# Altium footprint library DataDriven_PCB2.PcbLib: 59 footprints (part 4 of 4)
Each footprint in its own frame and in the unit in brackets; x right, y up, seen from the top. Pads: shape width x height; smd on the part's side, far side on the other; paste and mask are expansions set on the pad; w line width, h text height; cw(c..) or ccw(c..) is an arc to the next point about the centre after c.
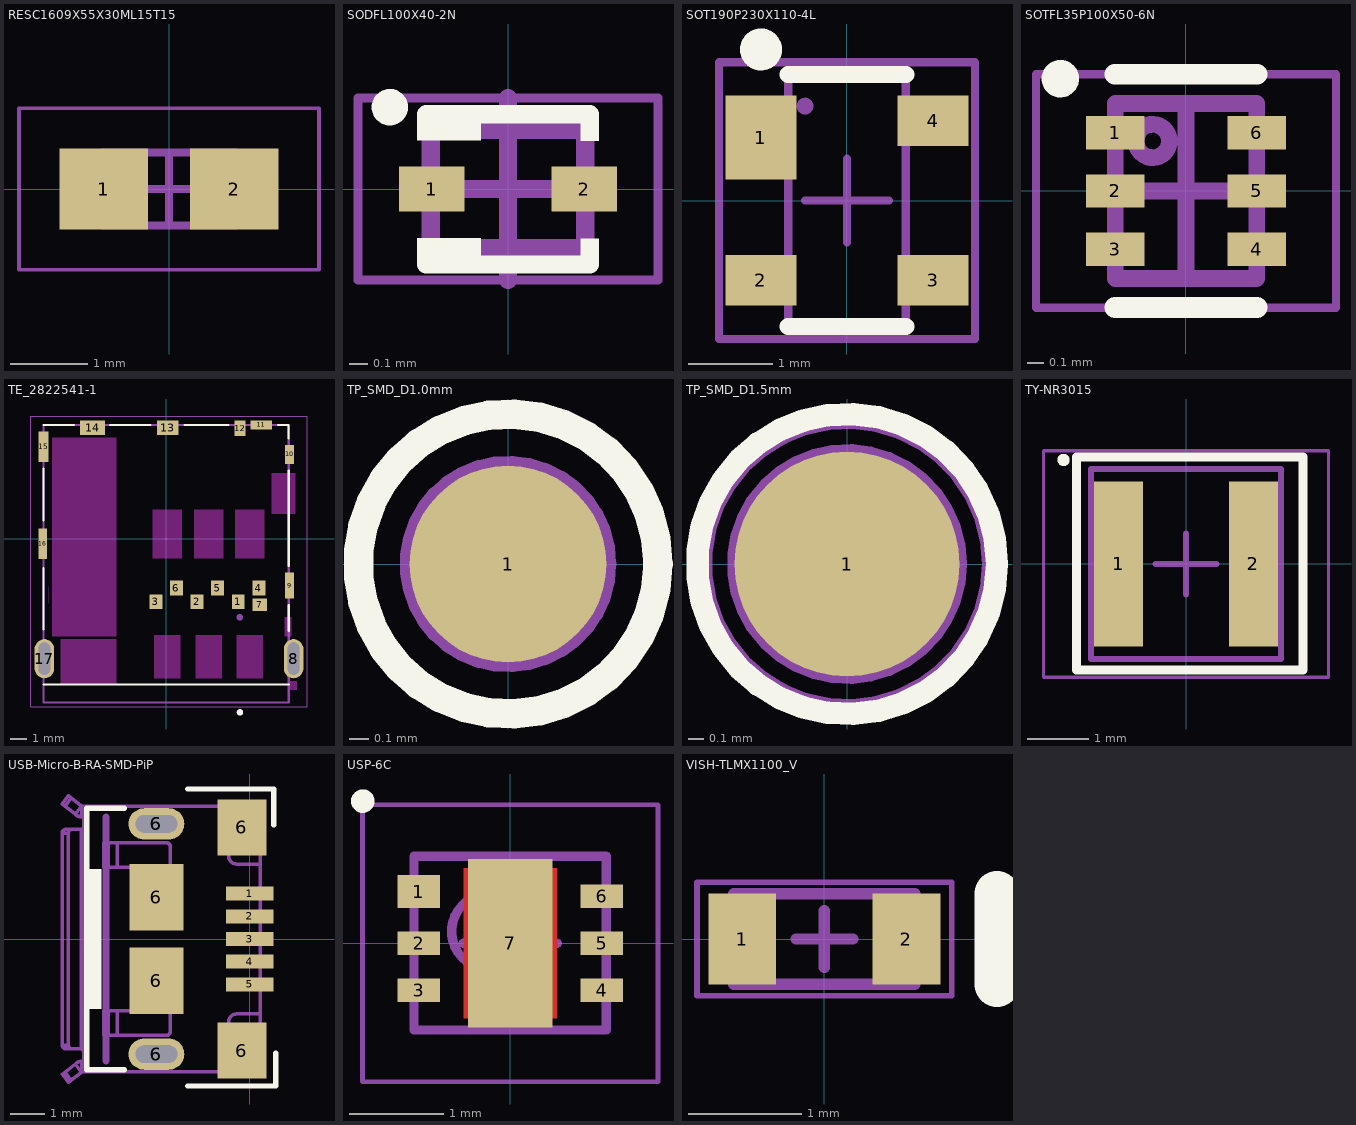
[diagram p3: the footprints below, top view; thin cyan lines are the x and y axes]

## RESC1609X55X30ML15T15 [mm] "Chip Resistor, 2-Leads, Body 1.75x0.95mm, IPC Low Density"
height 0.55
pads (2):
  rect 1.15x1.05 smd: 1(-0.85,0) 2(0.85,0)
Mechanical 13:
  lines w0.1: -0.875,-0.475 -0.875,0.475 0.875,0.475 0.875,-0.475 -0.875,-0.475
Mechanical 15:
  lines w0.05: -1.95,-1.05 -1.95,1.05 1.95,1.05 1.95,-1.05 -1.95,-1.05
  lines w0.1: -0.475,0 0.475,0 ; 0,-0.475 0,0.475
3D body "RESC1608X06M.step": height 0.55, standoff 0, extent -0.875,-0.475 0.875,0.475

## SODFL100X40-2N [mm]
pads (2):
  rect 0.36x0.25 smd: 1(-0.42,0) 2(0.42,0)
Top Overlay:
  circle w0.1: c-0.65,0.45 r0.05
  rectangle: 0.4,0.265 0.5,0.415
  rectangle: 0.4,-0.421 0.5,-0.271
  rectangle: -0.5,-0.396 -0.15,-0.271
  rectangle: -0.5,0.265 -0.15,0.39
  lines w0.1: -0.45,-0.365 -0.45,-0.415 0.45,-0.415 0.45,-0.349 ; -0.45,0.361 -0.45,0.411 0.45,0.411 0.45,0.361
Mechanical 7:
  lines w0.1: -0.425,-0.325 -0.425,0.325 0.425,0.325 0.425,-0.325 -0.425,-0.325
  text ".Designator" at -0.724,-0.177 h0.38
Mechanical 15:
  lines w0.05: -0.825,-0.5 0.825,-0.5 0.825,0.5 -0.825,0.5 -0.825,-0.5
  lines w0.1: -0.5,0 0.5,0 ; 0,-0.5 0,0.5
3D body "SODFL100X40-2N.step": height 0.4, standoff 0, extent -0.5,-0.325 0.5,0.325

## SOT190P230X110-4L [mm]
pads (4):
  rect 0.85x1 smd: 1(-1.025,0.75)
  rect 0.85x0.6 smd: 2(-1.025,-0.95) 3(1.025,-0.95) 4(1.025,0.95)
Top Overlay:
  circle w0.25: c-1.025,1.8 r0.125
  lines w0.203: -0.7,-1.5 0.7,-1.5 ; -0.7,1.5 0.7,1.5
Mechanical 7:
  circle w0.1: c-0.5,1.125 r0.05
  lines w0.1: -0.7,-1.5 -0.7,1.5 0.7,1.5 0.7,-1.5 -0.7,-1.5
  text ".Designator" at -0.225,1.375 h0.69
Mechanical 15:
  lines w0.1: -0.5,0 0.5,0 ; 0,-0.5 0,0.5 ; -1.525,-1.65 -1.525,1.65 1.525,1.65 1.525,-1.65 -1.525,-1.65
3D body "User Library-sot143.step": height 1, standoff 0, extent -1.21,-1.46 1.21,1.46

## SOTFL35P100X50-6N [mm]
pads (6):
  rect 0.35x0.2 smd mask+0.05: 1(-0.425,0.35) 2(-0.425,0) 3(-0.425,-0.35) 4(0.425,-0.35) 5(0.425,0) 6(0.425,0.35)
Top Overlay:
  circle w0.125: c-0.754,0.674 r0.05
  lines w0.125: -0.425,-0.7 0.425,-0.7 ; -0.425,0.7 0.425,0.7
Mechanical 7:
  circle w0.1: c-0.2,0.3 r0.1
  lines w0.1: -0.425,-0.525 0.425,-0.525 0.425,0.525 -0.425,0.525 -0.425,-0.525
  text ".Designator" at 0.325,-0.4 h0.3
Mechanical 15:
  lines w0.05: -0.9,-0.7 -0.9,0.7 0.9,0.7 0.9,-0.7 -0.9,-0.7
  lines w0.1: -0.5,0 0.5,0 ; 0,-0.5 0,0.5
3D body "SOTFL35P100X50-6N.step": height 0.5, standoff 0, extent -0.5,-0.523 0.5,0.523

## TE_2822541-1 [mm]
height 0.4
pads (17):
  rect 0.8x0.9 smd: 1(4.44,-3.88) 2(1.9,-3.88) 3(-0.64,-3.88) 4(5.71,-3.03) 5(3.17,-3.03) 6(0.63,-3.03)
  rect 0.9x0.75 smd: 7(5.77,-4.055)
  oval 1.208x2.416 hole 0.7 slot 2 at 90 deg: 8(7.85,-7.38) 17(-7.5,-7.38)
  rect 0.54x1.6 smd: 9(7.6,-2.88)
  rect 0.54x1.17 smd: 10(7.6,5.205)
  rect 1.33x0.55 smd: 11(5.865,7.025)
  rect 0.7x0.98 smd: 12(4.55,6.81)
  rect 1.3x0.91 smd: 13(0.1,6.845)
  rect 1.53x0.91 smd: 14(-4.535,6.845)
  rect 0.6x1.9 smd: 15(-7.55,5.67)
  rect 0.5x1.9 smd: 16(-7.6,-0.3)
Top Layer keep-out:
  region: -5.233,-8.9 -6.249,-8.9 -6.249,-8.59 -5.233,-8.59
  region: -3.089,-8.95 -6.503,-8.95 -6.503,-6.18 -3.089,-6.18
  region: -3.089,-8.95 -6.503,-8.95 -6.503,-6.18 -3.089,-6.18
  region: -5.795,-8.839 -6.195,-8.839 -6.195,-8.529 -5.795,-8.529
  region: -3.089,-5.989 -7.011,-5.989 -7.011,6.221 -3.089,6.221
  region: -3.089,-5.735 -6.757,-5.735 -6.757,5.949 -3.089,5.949
  region: -6.249,-5.735 -6.757,-5.735 -6.757,4.72 -6.249,4.72
  region: -7.257,-3.195 -7.256,-3.449 -7.257,-2.941 -7.25,-3.957
  region: 7.7,-5.735 7.3,-5.735 7.3,-4.83 7.7,-4.83
  region: 7.7,-5.989 7.3,-5.989 7.3,-4.83 7.7,-4.83
  region: 8.05,-9.037 7.65,-9.037 7.65,-8.783 8.05,-8.783
  region: 8.05,-9.291 7.65,-9.291 7.65,-9.037 8.05,-9.037
  region: 7.955,1.54 6.505,1.54 6.505,4.05 7.955,4.05
  region: 7.955,1.54 6.505,1.54 6.505,4.05 7.955,4.05
  region: 6.05,-1.21 4.26,-1.21 4.26,1.79 6.05,1.79
  region: 3.51,-1.21 1.72,-1.21 1.72,1.79 3.51,1.79
  region: 3.51,-1.21 1.72,-1.21 1.72,1.79 3.51,1.79
  region: 6.05,-1.21 4.26,-1.21 4.26,1.79 6.05,1.79
  region: 0.97,-1.21 -0.82,-1.21 -0.82,1.79 0.97,1.79
  region: 0.97,-1.21 -0.82,-1.21 -0.82,1.79 0.97,1.79
  region: 0.87,-8.6 -0.72,-8.6 -0.72,-5.93 0.87,-5.93
  region: 0.87,-8.6 -0.72,-8.6 -0.72,-5.93 0.87,-5.93
  region: 3.41,-8.6 1.82,-8.6 1.82,-5.93 3.41,-5.93
  region: 3.41,-8.6 1.82,-8.6 1.82,-5.93 3.41,-5.93
  region: 5.95,-8.6 4.36,-8.6 4.36,-5.93 5.95,-5.93
  region: 5.95,-8.6 4.36,-8.6 4.36,-5.93 5.95,-5.93
Top Overlay:
  circle w0.2: c4.546,-10.688 r0.1
  lines w0.127: -7.55,-8.98 7.55,-8.98 ; -7.55,-5.58 -7.55,-1.79 ; -7.55,1.13 -7.55,4.32 ; -7.55,7 -5.665,7 ; -3.465,7 -0.965,7 ; 1.135,7 3.835,7 ; 6.885,7 7.535,7 7.535,6.17 ; 7.55,-5.68 7.55,-4.08 ; 7.55,-1.68 7.55,4.22
Mechanical 13:
  circle w0.2: c4.535,-4.83 r0.1
  lines w0.127: -7.55,-10.08 7.55,-10.08 7.55,7 -7.55,7 -7.55,-10.08
Mechanical 15:
  lines w0.05: -8.355,-10.33 8.705,-10.33 8.705,7.55 -8.355,7.55 -8.355,-10.33
3D body "c-2822541-1-c-3d.stp": height 1.29, standoff -0.6, extent -7.6,-8.89 7.89,7.11

## TP_SMD_D1.0mm [mm]
height 0.9
pads (1):
  round 1 smd paste-5: 1(0,0)
Top Overlay:
  circle w0.15: c0,0 r0.762
Mechanical 7:
  circle w0.1: c0,0 r0.762
  circle w0.1: c0,0 r0.5
  text ".Designator" at -0.633,0.918 h0.38

## TP_SMD_D1.5mm [mm]
height 0.9
pads (1):
  round 1.5 smd paste-5: 1(0,0)
Top Overlay:
  circle w0.15: c0,0 r1
Mechanical 7:
  circle w0.1: c0,0 r0.75
  circle w0.1: c0,0 r0.95
  text ".Designator" at -0.3,1.3 h0.38
3D body: height 0.05, standoff 0, extent -0.75,-0.75 0.75,0.75

## TY-NR3015 [mm]
pads (2):
  rect 0.8x2.7 smd: 1(-1.1,0) 2(1.1,0)
Top Overlay:
  circle w0.1: c-2,1.7 r0.05
  lines w0.15: -1.788,-1.731 -1.788,1.749 1.909,1.749 1.909,-1.731 -1.788,-1.731
Mechanical 7:
  lines w0.1: -1.55,-1.55 1.55,-1.55 1.55,1.55 -1.55,1.55 -1.55,-1.55
  text ".Designator" at -1.143,0 h0.38
Mechanical 13:
  lines w0.1: -1.55,-1.55 1.55,-1.55 1.55,1.55 -1.55,1.55 -1.55,-1.55
Mechanical 15:
  lines w0.05: -2.325,-1.85 -2.325,1.85 2.325,1.85 2.325,-1.85 -2.325,-1.85
  lines w0.1: -0.5,0 0.5,0 ; 0,-0.5 0,0.5
3D body "User Library-nr3015.step": height 1.35, standoff -0.15, extent -1.5,-1.5 1.5,1.5

## USB-Micro-B-RA-SMD-PiP [mm]
pads (13):
  rect 1.35x0.4 smd: 1(0,1.3) 2(0,0.65) 3(0,0) 4(0,-0.65) 5(0,-1.3)
  oval 1.6x0.9 hole 0.5 slot 1.2 at 0 deg: 6(-2.675,-3.3) 6(-2.675,3.3)
  oval 2x1.5 on Top Paste: 6(-2.675,-3.3) 6(-2.675,3.3)
  rect 1.55x1.9 smd: 6(-2.675,-1.2) 6(-2.675,1.2)
  rect 1.4x1.6 smd: 6(-0.225,-3.2) 6(-0.225,3.2)
Top Overlay:
  rectangle: -4.75,-2 -4.25,2
  lines w0.152: -3.6,-3.75 -4.675,-3.75 -4.675,3.75 -3.6,3.75 ; -1.775,-4.214 0.746,-4.214 0.746,-3.275 ; -1.775,4.298 0.689,4.298 0.689,3.275
Mechanical 7:
  drawing of 2738 lines, arcs and shapes, not listed
  text ".Designator" at -4.125,-0.127 h0.38
Mechanical 15:
  lines w0.203: -4.125,-3.5 -4.125,3.5
3D body "User Library-MicroUSB-B_Molex_105017-0001.step": height 2.72, standoff -0.59, extent -5.28,-4.1 0.15,4.1

## USP-6C [mm]
height 0.9
pads (7):
  rect 0.45x0.35 smd paste-0.05: 1(-0.975,0.55)
  rect 0.45x0.25 smd paste-0.05: 2(-0.975,0) 3(-0.975,-0.5) 4(0.975,-0.5) 5(0.975,0) 6(0.975,0.5)
  rect 0.9x1.8 smd paste-2: 7(0,0)
Top Layer:
  rectangle: -0.5,-0.8 0.5,0.8
Top Overlay:
  circle w0.15: c-1.572,1.515 r0.05
Top Paste:
  rectangle: -0.4,0.3 0.4,0.6
  rectangle: -0.25,0.325 0.25,0.7
  region: 0.25,-0.325 -0.25,-0.325 -0.25,-0.7 0.25,-0.7
  region: 0.4,-0.3 -0.4,-0.3 -0.4,-0.6 0.4,-0.6
  rectangle: -1.15,0.375 -0.8,0.725
  rectangle: -1.15,-0.125 -0.8,0.125
  rectangle: -1.15,-0.625 -0.8,-0.375
  rectangle: 0.8,-0.625 1.15,-0.375
  rectangle: 0.8,-0.125 1.15,0.125
  rectangle: 0.8,0.375 1.15,0.625
Mechanical 7:
  circle w0.1: c-0.225,0.125 r0.4
  lines w0.1: -1.025,-0.925 -1.025,0.925 1.025,0.925 1.025,-0.925 -1.025,-0.925
  text ".Designator" at 0.125,-0.6 h0.38
Mechanical 15:
  lines w0.05: -1.575,-1.475 -1.575,1.475 1.575,1.475 1.575,-1.475 -1.575,-1.475
  lines w0.1: -0.5,0 0.5,0 ; 0,-0.5 0,0.5
3D body "QFN50P200X180X60_HS-7N.step": height 0.6, standoff 0, extent -0.926,-1.025 0.926,1.025

## VISH-TLMX1100_V [mm] "SMD, 2-Leads, Body 1.6x0.8mm"
height 0.65
pads (2):
  rect 0.6x0.8 smd: 1(-0.725,0) 2(0.725,0)
Top Overlay:
  lines w0.4: 1.525,-0.4 1.525,0.4
Mechanical 13:
  lines w0.1: -0.8,-0.4 0.8,-0.4 0.8,0.4 -0.8,0.4 -0.8,-0.4
Mechanical 15:
  lines w0.05: -1.125,-0.5 -1.125,0.5 1.125,0.5 1.125,-0.5 -1.125,-0.5
  lines w0.1: -0.25,0 0.25,0 ; 0,-0.25 0,0.25
3D body: height 0.65, standoff 0, extent -0.8,-0.4 0.8,0.4